# Altium footprint library Connector_PinHeader_1.00mm.PcbLib: 278 footprints (part 14 of 18) (continued)
## PinHeader_2x20_P1.00mm_Horizontal [mm] (continued)
F.CrtYd:
  lines w0.05: -1,-20 5.6,-20 5.6,1 -1,1 -1,-20
F.Fab:
  lines w0.1: 1.9,-19.15 -0.15,-19.15 -0.15,-18.85 1.9,-18.85 ; 1.9,-18.15 -0.15,-18.15 -0.15,-17.85 1.9,-17.85 ; 1.9,-17.15 -0.15,-17.15 -0.15,-16.85 1.9,-16.85 ; 1.9,-16.15 -0.15,-16.15 -0.15,-15.85 1.9,-15.85 ; 1.9,-15.15 -0.15,-15.15 -0.15,-14.85 1.9,-14.85 ; 1.9,-14.15 -0.15,-14.15 -0.15,-13.85 1.9,-13.85 ; 1.9,-13.15 -0.15,-13.15 -0.15,-12.85 1.9,-12.85 ; 1.9,-12.15 -0.15,-12.15 -0.15,-11.85 1.9,-11.85 ; 1.9,-11.15 -0.15,-11.15 -0.15,-10.85 1.9,-10.85 ; 1.9,-10.15 -0.15,-10.15 -0.15,-9.85 1.9,-9.85 ; 1.9,-9.15 -0.15,-9.15 -0.15,-8.85 1.9,-8.85 ; 1.9,-8.15 -0.15,-8.15 -0.15,-7.85 1.9,-7.85 ; 1.9,-7.15 -0.15,-7.15 -0.15,-6.85 1.9,-6.85 ; 1.9,-6.15 -0.15,-6.15 -0.15,-5.85 1.9,-5.85 ; 1.9,-5.15 -0.15,-5.15 -0.15,-4.85 1.9,-4.85 ; 1.9,-4.15 -0.15,-4.15 -0.15,-3.85 1.9,-3.85 ; 1.9,-3.15 -0.15,-3.15 -0.15,-2.85 1.9,-2.85 ; 1.9,-2.15 -0.15,-2.15 -0.15,-1.85 1.9,-1.85 ; 1.9,-1.15 -0.15,-1.15 -0.15,-0.85 1.9,-0.85 ; 1.9,-0.15 -0.15,-0.15 -0.15,0.15 1.9,0.15 ; 3.1,-19.15 5.1,-19.15 5.1,-18.85 3.1,-18.85 ; 3.1,-18.15 5.1,-18.15 5.1,-17.85 3.1,-17.85 ; 3.1,-17.15 5.1,-17.15 5.1,-16.85 3.1,-16.85 ; 3.1,-16.15 5.1,-16.15 5.1,-15.85 3.1,-15.85 ; 3.1,-15.15 5.1,-15.15 5.1,-14.85 3.1,-14.85 ; 3.1,-14.15 5.1,-14.15 5.1,-13.85 3.1,-13.85 ; 3.1,-13.15 5.1,-13.15 5.1,-12.85 3.1,-12.85 ; 3.1,-12.15 5.1,-12.15 5.1,-11.85 3.1,-11.85 ; 3.1,-11.15 5.1,-11.15 5.1,-10.85 3.1,-10.85 ; 3.1,-10.15 5.1,-10.15 5.1,-9.85 3.1,-9.85 ; 3.1,-9.15 5.1,-9.15 5.1,-8.85 3.1,-8.85 ; 3.1,-8.15 5.1,-8.15 5.1,-7.85 3.1,-7.85 ; 3.1,-7.15 5.1,-7.15 5.1,-6.85 3.1,-6.85 ; 3.1,-6.15 5.1,-6.15 5.1,-5.85 3.1,-5.85 ; 3.1,-5.15 5.1,-5.15 5.1,-4.85 3.1,-4.85 ; 3.1,-4.15 5.1,-4.15 5.1,-3.85 3.1,-3.85 ; 3.1,-3.15 5.1,-3.15 5.1,-2.85 3.1,-2.85 ; 3.1,-2.15 5.1,-2.15 5.1,-1.85 3.1,-1.85 ; 3.1,-1.15 5.1,-1.15 5.1,-0.85 3.1,-0.85 ; 3.1,-0.15 5.1,-0.15 5.1,0.15 3.1,0.15 ; 1.9,-19.5 1.9,0.2 2.2,0.5 3.1,0.5 3.1,-19.5 1.9,-19.5
  text "'.Designator'" at 3.105,-12.414 h0.72

## PinHeader_2x20_P1.00mm_Vertical [mm]
pads (40):
  rect 0.85x0.85 hole 0.5: 1(0,0)
  rrect100% 0.85x0.85 hole 0.5: 2(1,0) 3(0,-1) 4(1,-1) 5(0,-2) 6(1,-2) 7(0,-3) 8(1,-3) 9(0,-4) 10(1,-4) 11(0,-5) 12(1,-5) 13(0,-6) 14(1,-6) 15(0,-7) 16(1,-7) 17(0,-8) 18(1,-8) 19(0,-9) 20(1,-9) 21(0,-10) 22(1,-10) 23(0,-11) 24(1,-11) 25(0,-12) 26(1,-12) 27(0,-13) 28(1,-13) 29(0,-14) 30(1,-14) 31(0,-15) 32(1,-15) 33(0,-16) 34(1,-16) 35(0,-17) 36(1,-17) 37(0,-18) 38(1,-18) 39(0,-19) 40(1,-19)
F.SilkS:
  lines w0.12: -0.71,0 -0.71,0.685 0,0.685 ; -0.608,-0.685 -0.71,-0.685 -0.71,-19.56 -0.394,-19.56 ; 0.394,-19.56 0.606,-19.56 ; 1.394,-19.56 1.71,-19.56 1.71,0.56 1.394,0.56
F.CrtYd:
  lines w0.05: -1.15,-20 2.15,-20 2.15,1 -1.15,1 -1.15,-20
F.Fab:
  lines w0.1: -0.65,-19.5 1.65,-19.5 1.65,0.5 -0.075,0.5 -0.65,-0.075 -0.65,-19.5
  text "'.Designator'" at 1.34,-13.547 h1

## PinHeader_2x20_P1.00mm_Vertical_SMD [mm]
pads (40):
  rect 2x0.5 smd: 1(-1.65,9.5) 2(1.65,9.5) 3(-1.65,8.5) 4(1.65,8.5) 5(-1.65,7.5) 6(1.65,7.5) 7(-1.65,6.5) 8(1.65,6.5) 9(-1.65,5.5) 10(1.65,5.5) 11(-1.65,4.5) 12(1.65,4.5) 13(-1.65,3.5) 14(1.65,3.5) 15(-1.65,2.5) 16(1.65,2.5) 17(-1.65,1.5) 18(1.65,1.5) 19(-1.65,0.5) 20(1.65,0.5) 21(-1.65,-0.5) 22(1.65,-0.5) 23(-1.65,-1.5) 24(1.65,-1.5) 25(-1.65,-2.5) 26(1.65,-2.5) 27(-1.65,-3.5) 28(1.65,-3.5) 29(-1.65,-4.5) 30(1.65,-4.5) 31(-1.65,-5.5) 32(1.65,-5.5) 33(-1.65,-6.5) 34(1.65,-6.5) 35(-1.65,-7.5) 36(1.65,-7.5) 37(-1.65,-8.5) 38(1.65,-8.5) 39(-1.65,-9.5) 40(1.65,-9.5)
F.SilkS:
  lines w0.12: -2.59,10.01 -1.21,10.01 -1.21,10.06 1.21,10.06 1.21,10.01 ; -1.21,-10.01 -1.21,-10.06 1.21,-10.06 1.21,-10.01
F.CrtYd:
  lines w0.05: -3.65,-10.5 3.65,-10.5 3.65,10.5 -3.65,10.5 -3.65,-10.5
F.Fab:
  lines w0.1: -1.15,-9.65 -2.4,-9.65 -2.4,-9.35 -1.15,-9.35 ; -1.15,-8.65 -2.4,-8.65 -2.4,-8.35 -1.15,-8.35 ; -1.15,-7.65 -2.4,-7.65 -2.4,-7.35 -1.15,-7.35 ; -1.15,-6.65 -2.4,-6.65 -2.4,-6.35 -1.15,-6.35 ; -1.15,-5.65 -2.4,-5.65 -2.4,-5.35 -1.15,-5.35 ; -1.15,-4.65 -2.4,-4.65 -2.4,-4.35 -1.15,-4.35 ; -1.15,-3.65 -2.4,-3.65 -2.4,-3.35 -1.15,-3.35 ; -1.15,-2.65 -2.4,-2.65 -2.4,-2.35 -1.15,-2.35 ; -1.15,-1.65 -2.4,-1.65 -2.4,-1.35 -1.15,-1.35 ; -1.15,-0.65 -2.4,-0.65 -2.4,-0.35 -1.15,-0.35 ; -1.15,0.35 -2.4,0.35 -2.4,0.65 -1.15,0.65 ; -1.15,1.35 -2.4,1.35 -2.4,1.65 -1.15,1.65 ; -1.15,2.35 -2.4,2.35 -2.4,2.65 -1.15,2.65 ; -1.15,3.35 -2.4,3.35 -2.4,3.65 -1.15,3.65 ; -1.15,4.35 -2.4,4.35 -2.4,4.65 -1.15,4.65 ; -1.15,5.35 -2.4,5.35 -2.4,5.65 -1.15,5.65 ; -1.15,6.35 -2.4,6.35 -2.4,6.65 -1.15,6.65 ; -1.15,7.35 -2.4,7.35 -2.4,7.65 -1.15,7.65 ; -1.15,8.35 -2.4,8.35 -2.4,8.65 -1.15,8.65 ; -1.15,9.35 -2.4,9.35 -2.4,9.65 -1.15,9.65 ; 1.15,-9.65 2.4,-9.65 2.4,-9.35 1.15,-9.35 ; 1.15,-8.65 2.4,-8.65 2.4,-8.35 1.15,-8.35 ; 1.15,-7.65 2.4,-7.65 2.4,-7.35 1.15,-7.35 ; 1.15,-6.65 2.4,-6.65 2.4,-6.35 1.15,-6.35 ; 1.15,-5.65 2.4,-5.65 2.4,-5.35 1.15,-5.35 ; 1.15,-4.65 2.4,-4.65 2.4,-4.35 1.15,-4.35 ; 1.15,-3.65 2.4,-3.65 2.4,-3.35 1.15,-3.35 ; 1.15,-2.65 2.4,-2.65 2.4,-2.35 1.15,-2.35 ; 1.15,-1.65 2.4,-1.65 2.4,-1.35 1.15,-1.35 ; 1.15,-0.65 2.4,-0.65 2.4,-0.35 1.15,-0.35 ; 1.15,0.35 2.4,0.35 2.4,0.65 1.15,0.65 ; 1.15,1.35 2.4,1.35 2.4,1.65 1.15,1.65 ; 1.15,2.35 2.4,2.35 2.4,2.65 1.15,2.65 ; 1.15,3.35 2.4,3.35 2.4,3.65 1.15,3.65 ; 1.15,4.35 2.4,4.35 2.4,4.65 1.15,4.65 ; 1.15,5.35 2.4,5.35 2.4,5.65 1.15,5.65 ; 1.15,6.35 2.4,6.35 2.4,6.65 1.15,6.65 ; 1.15,7.35 2.4,7.35 2.4,7.65 1.15,7.65 ; 1.15,8.35 2.4,8.35 2.4,8.65 1.15,8.65 ; 1.15,9.35 2.4,9.35 2.4,9.65 1.15,9.65 ; -1.15,9.65 -1.15,-10 1.15,-10 1.15,10 -0.8,10 -1.15,9.65
  text "'.Designator'" at 0.84,-4.047 h1

## PinHeader_2x21_P1.00mm_Horizontal [mm]
pads (42):
  rect 0.85x0.85 hole 0.5: 1(0,0)
  rrect100% 0.85x0.85 hole 0.5: 2(1,0) 3(0,-1) 4(1,-1) 5(0,-2) 6(1,-2) 7(0,-3) 8(1,-3) 9(0,-4) 10(1,-4) 11(0,-5) 12(1,-5) 13(0,-6) 14(1,-6) 15(0,-7) 16(1,-7) 17(0,-8) 18(1,-8) 19(0,-9) 20(1,-9) 21(0,-10) 22(1,-10) 23(0,-11) 24(1,-11) 25(0,-12) 26(1,-12) 27(0,-13) 28(1,-13) 29(0,-14) 30(1,-14) 31(0,-15) 32(1,-15) 33(0,-16) 34(1,-16) 35(0,-17) 36(1,-17) 37(0,-18) 38(1,-18) 39(0,-19) 40(1,-19) 41(0,-20) 42(1,-20)
F.SilkS:
  lines w0.12: -0.685,0 -0.685,0.685 0,0.685 ; 1.652,-20.21 1.84,-20.21 ; 1.652,-19.79 1.84,-19.79 ; 1.652,-19.21 1.84,-19.21 ; 1.652,-18.79 1.84,-18.79 ; 1.652,-18.21 1.84,-18.21 ; 1.652,-17.79 1.84,-17.79 ; 1.652,-17.21 1.84,-17.21 ; 1.652,-16.79 1.84,-16.79 ; 1.652,-16.21 1.84,-16.21 ; 1.652,-15.79 1.84,-15.79 ; 1.652,-15.21 1.84,-15.21 ; 1.652,-14.79 1.84,-14.79 ; 1.652,-14.21 1.84,-14.21 ; 1.652,-13.79 1.84,-13.79 ; 1.652,-13.21 1.84,-13.21 ; 1.652,-12.79 1.84,-12.79 ; 1.652,-12.21 1.84,-12.21 ; 1.652,-11.79 1.84,-11.79 ; 1.652,-11.21 1.84,-11.21 ; 1.652,-10.79 1.84,-10.79 ; 1.652,-10.21 1.84,-10.21 ; 1.652,-9.79 1.84,-9.79 ; 1.652,-9.21 1.84,-9.21 ; 1.652,-8.79 1.84,-8.79 ; 1.652,-8.21 1.84,-8.21 ; 1.652,-7.79 1.84,-7.79 ; 1.652,-7.21 1.84,-7.21 ; 1.652,-6.79 1.84,-6.79 ; 1.652,-6.21 1.84,-6.21 ; 1.652,-5.79 1.84,-5.79 ; 1.652,-5.21 1.84,-5.21 ; 1.652,-4.79 1.84,-4.79 ; 1.652,-4.21 1.84,-4.21 ; 1.652,-3.79 1.84,-3.79 ; 1.652,-3.21 1.84,-3.21 ; 1.652,-2.79 1.84,-2.79 ; 1.652,-2.21 1.84,-2.21 ; 1.652,-1.79 1.84,-1.79 ; 1.652,-1.21 1.84,-1.21 ; 1.652,-0.79 1.84,-0.79 ; 1.652,-0.21 1.84,-0.21 ; 1.652,0.21 1.84,0.21 ; 1.84,-19.5 3.16,-19.5 ; 1.84,-18.5 3.16,-18.5 ; 1.84,-17.5 3.16,-17.5 ; 1.84,-16.5 3.16,-16.5 ; 1.84,-15.5 3.16,-15.5 ; 1.84,-14.5 3.16,-14.5 ; 1.84,-13.5 3.16,-13.5 ; 1.84,-12.5 3.16,-12.5 ; 1.84,-11.5 3.16,-11.5 ; 1.84,-10.5 3.16,-10.5 ; 1.84,-9.5 3.16,-9.5 ; 1.84,-8.5 3.16,-8.5 ; 1.84,-7.5 3.16,-7.5 ; 1.84,-6.5 3.16,-6.5 ; 1.84,-5.5 3.16,-5.5 ; 1.84,-4.5 3.16,-4.5 ; 1.84,-3.5 3.16,-3.5 ; 1.84,-2.5 3.16,-2.5 ; 1.84,-1.5 3.16,-1.5 ; 1.84,-0.5 3.16,-0.5 ; 3.16,-20.21 5.16,-20.21 5.16,-19.79 3.16,-19.79 ; 3.16,-19.21 5.16,-19.21 5.16,-18.79 3.16,-18.79 ; 3.16,-18.21 5.16,-18.21 5.16,-17.79 3.16,-17.79 ; 3.16,-17.21 5.16,-17.21 5.16,-16.79 3.16,-16.79 ; 3.16,-16.21 5.16,-16.21 5.16,-15.79 3.16,-15.79 ; 3.16,-15.21 5.16,-15.21 5.16,-14.79 3.16,-14.79 ; 3.16,-14.21 5.16,-14.21 5.16,-13.79 3.16,-13.79 ; 3.16,-13.21 5.16,-13.21 5.16,-12.79 3.16,-12.79 ; 3.16,-12.21 5.16,-12.21 5.16,-11.79 3.16,-11.79 ; 3.16,-11.21 5.16,-11.21 5.16,-10.79 3.16,-10.79 ; 3.16,-10.21 5.16,-10.21 5.16,-9.79 3.16,-9.79 ; 3.16,-9.21 5.16,-9.21 5.16,-8.79 3.16,-8.79 ; 3.16,-8.21 5.16,-8.21 5.16,-7.79 3.16,-7.79 ; 3.16,-7.21 5.16,-7.21 5.16,-6.79 3.16,-6.79 ; 3.16,-6.21 5.16,-6.21 5.16,-5.79 3.16,-5.79 ; 3.16,-5.21 5.16,-5.21 5.16,-4.79 3.16,-4.79 ; 3.16,-4.21 5.16,-4.21 5.16,-3.79 3.16,-3.79 ; 3.16,-3.21 5.16,-3.21 5.16,-2.79 3.16,-2.79 ; 3.16,-2.21 5.16,-2.21 5.16,-1.79 3.16,-1.79 ; 3.16,-1.21 5.16,-1.21 5.16,-0.79 3.16,-0.79 ; 3.16,-0.21 5.16,-0.21 5.16,0.21 3.16,0.21 ; 3.16,-0.09 5.16,-0.09 ; 3.16,0.03 5.16,0.03 ; 3.16,0.15 5.16,0.15 ; 1.84,-20.56 3.16,-20.56 3.16,0.56 1.84,0.56 1.84,-20.56
F.CrtYd:
  lines w0.05: -1,-21 -1,1 5.6,1 5.6,-21 -1,-21
F.Fab:
  lines w0.1: 1.9,-20.15 -0.15,-20.15 -0.15,-19.85 1.9,-19.85 ; 1.9,-19.15 -0.15,-19.15 -0.15,-18.85 1.9,-18.85 ; 1.9,-18.15 -0.15,-18.15 -0.15,-17.85 1.9,-17.85 ; 1.9,-17.15 -0.15,-17.15 -0.15,-16.85 1.9,-16.85 ; 1.9,-16.15 -0.15,-16.15 -0.15,-15.85 1.9,-15.85 ; 1.9,-15.15 -0.15,-15.15 -0.15,-14.85 1.9,-14.85 ; 1.9,-14.15 -0.15,-14.15 -0.15,-13.85 1.9,-13.85 ; 1.9,-13.15 -0.15,-13.15 -0.15,-12.85 1.9,-12.85 ; 1.9,-12.15 -0.15,-12.15 -0.15,-11.85 1.9,-11.85 ; 1.9,-11.15 -0.15,-11.15 -0.15,-10.85 1.9,-10.85 ; 1.9,-10.15 -0.15,-10.15 -0.15,-9.85 1.9,-9.85 ; 1.9,-9.15 -0.15,-9.15 -0.15,-8.85 1.9,-8.85 ; 1.9,-8.15 -0.15,-8.15 -0.15,-7.85 1.9,-7.85 ; 1.9,-7.15 -0.15,-7.15 -0.15,-6.85 1.9,-6.85 ; 1.9,-6.15 -0.15,-6.15 -0.15,-5.85 1.9,-5.85 ; 1.9,-5.15 -0.15,-5.15 -0.15,-4.85 1.9,-4.85 ; 1.9,-4.15 -0.15,-4.15 -0.15,-3.85 1.9,-3.85 ; 1.9,-3.15 -0.15,-3.15 -0.15,-2.85 1.9,-2.85 ; 1.9,-2.15 -0.15,-2.15 -0.15,-1.85 1.9,-1.85 ; 1.9,-1.15 -0.15,-1.15 -0.15,-0.85 1.9,-0.85 ; 1.9,-0.15 -0.15,-0.15 -0.15,0.15 1.9,0.15 ; 3.1,-20.15 5.1,-20.15 5.1,-19.85 3.1,-19.85 ; 3.1,-19.15 5.1,-19.15 5.1,-18.85 3.1,-18.85 ; 3.1,-18.15 5.1,-18.15 5.1,-17.85 3.1,-17.85 ; 3.1,-17.15 5.1,-17.15 5.1,-16.85 3.1,-16.85 ; 3.1,-16.15 5.1,-16.15 5.1,-15.85 3.1,-15.85 ; 3.1,-15.15 5.1,-15.15 5.1,-14.85 3.1,-14.85 ; 3.1,-14.15 5.1,-14.15 5.1,-13.85 3.1,-13.85 ; 3.1,-13.15 5.1,-13.15 5.1,-12.85 3.1,-12.85 ; 3.1,-12.15 5.1,-12.15 5.1,-11.85 3.1,-11.85 ; 3.1,-11.15 5.1,-11.15 5.1,-10.85 3.1,-10.85 ; 3.1,-10.15 5.1,-10.15 5.1,-9.85 3.1,-9.85 ; 3.1,-9.15 5.1,-9.15 5.1,-8.85 3.1,-8.85 ; 3.1,-8.15 5.1,-8.15 5.1,-7.85 3.1,-7.85 ; 3.1,-7.15 5.1,-7.15 5.1,-6.85 3.1,-6.85 ; 3.1,-6.15 5.1,-6.15 5.1,-5.85 3.1,-5.85 ; 3.1,-5.15 5.1,-5.15 5.1,-4.85 3.1,-4.85 ; 3.1,-4.15 5.1,-4.15 5.1,-3.85 3.1,-3.85 ; 3.1,-3.15 5.1,-3.15 5.1,-2.85 3.1,-2.85 ; 3.1,-2.15 5.1,-2.15 5.1,-1.85 3.1,-1.85 ; 3.1,-1.15 5.1,-1.15 5.1,-0.85 3.1,-0.85 ; 3.1,-0.15 5.1,-0.15 5.1,0.15 3.1,0.15 ; 1.9,-20.5 1.9,0.2 2.2,0.5 3.1,0.5 3.1,-20.5 1.9,-20.5
  text "'.Designator'" at 3.105,-12.914 h0.72

## PinHeader_2x21_P1.00mm_Vertical [mm]
pads (42):
  rect 0.85x0.85 hole 0.5: 1(0,0)
  rrect100% 0.85x0.85 hole 0.5: 2(1,0) 3(0,-1) 4(1,-1) 5(0,-2) 6(1,-2) 7(0,-3) 8(1,-3) 9(0,-4) 10(1,-4) 11(0,-5) 12(1,-5) 13(0,-6) 14(1,-6) 15(0,-7) 16(1,-7) 17(0,-8) 18(1,-8) 19(0,-9) 20(1,-9) 21(0,-10) 22(1,-10) 23(0,-11) 24(1,-11) 25(0,-12) 26(1,-12) 27(0,-13) 28(1,-13) 29(0,-14) 30(1,-14) 31(0,-15) 32(1,-15) 33(0,-16) 34(1,-16) 35(0,-17) 36(1,-17) 37(0,-18) 38(1,-18) 39(0,-19) 40(1,-19) 41(0,-20) 42(1,-20)
F.SilkS:
  lines w0.12: -0.71,0 -0.71,0.685 0,0.685 ; -0.608,-0.685 -0.71,-0.685 -0.71,-20.56 -0.394,-20.56 ; 0.394,-20.56 0.606,-20.56 ; 1.394,-20.56 1.71,-20.56 1.71,0.56 1.394,0.56
F.CrtYd:
  lines w0.05: -1.15,-21 -1.15,1 2.15,1 2.15,-21 -1.15,-21
F.Fab:
  lines w0.1: -0.65,-20.5 -0.65,-0.075 -0.075,0.5 1.65,0.5 1.65,-20.5 -0.65,-20.5
  text "'.Designator'" at 1.34,-14.047 h1

## PinHeader_2x21_P1.00mm_Vertical_SMD [mm]
pads (42):
  rect 2x0.5 smd: 1(-1.65,10) 2(1.65,10) 3(-1.65,9) 4(1.65,9) 5(-1.65,8) 6(1.65,8) 7(-1.65,7) 8(1.65,7) 9(-1.65,6) 10(1.65,6) 11(-1.65,5) 12(1.65,5) 13(-1.65,4) 14(1.65,4) 15(-1.65,3) 16(1.65,3) 17(-1.65,2) 18(1.65,2) 19(-1.65,1) 20(1.65,1) 21(-1.65,0) 22(1.65,0) 23(-1.65,-1) 24(1.65,-1) 25(-1.65,-2) 26(1.65,-2) 27(-1.65,-3) 28(1.65,-3) 29(-1.65,-4) 30(1.65,-4) 31(-1.65,-5) 32(1.65,-5) 33(-1.65,-6) 34(1.65,-6) 35(-1.65,-7) 36(1.65,-7) 37(-1.65,-8) 38(1.65,-8) 39(-1.65,-9) 40(1.65,-9) 41(-1.65,-10) 42(1.65,-10)
F.SilkS:
  lines w0.12: -2.59,10.51 -1.21,10.51 -1.21,10.56 1.21,10.56 1.21,10.51 ; -1.21,-10.51 -1.21,-10.56 1.21,-10.56 1.21,-10.51
F.CrtYd:
  lines w0.05: -3.65,-11 3.65,-11 3.65,11 -3.65,11 -3.65,-11
F.Fab:
  lines w0.1: -1.15,-10.15 -2.4,-10.15 -2.4,-9.85 -1.15,-9.85 ; -1.15,-9.15 -2.4,-9.15 -2.4,-8.85 -1.15,-8.85 ; -1.15,-8.15 -2.4,-8.15 -2.4,-7.85 -1.15,-7.85 ; -1.15,-7.15 -2.4,-7.15 -2.4,-6.85 -1.15,-6.85 ; -1.15,-6.15 -2.4,-6.15 -2.4,-5.85 -1.15,-5.85 ; -1.15,-5.15 -2.4,-5.15 -2.4,-4.85 -1.15,-4.85 ; -1.15,-4.15 -2.4,-4.15 -2.4,-3.85 -1.15,-3.85 ; -1.15,-3.15 -2.4,-3.15 -2.4,-2.85 -1.15,-2.85 ; -1.15,-2.15 -2.4,-2.15 -2.4,-1.85 -1.15,-1.85 ; -1.15,-1.15 -2.4,-1.15 -2.4,-0.85 -1.15,-0.85 ; -1.15,-0.15 -2.4,-0.15 -2.4,0.15 -1.15,0.15 ; -1.15,0.85 -2.4,0.85 -2.4,1.15 -1.15,1.15 ; -1.15,1.85 -2.4,1.85 -2.4,2.15 -1.15,2.15 ; -1.15,2.85 -2.4,2.85 -2.4,3.15 -1.15,3.15 ; -1.15,3.85 -2.4,3.85 -2.4,4.15 -1.15,4.15 ; -1.15,4.85 -2.4,4.85 -2.4,5.15 -1.15,5.15 ; -1.15,5.85 -2.4,5.85 -2.4,6.15 -1.15,6.15 ; -1.15,6.85 -2.4,6.85 -2.4,7.15 -1.15,7.15 ; -1.15,7.85 -2.4,7.85 -2.4,8.15 -1.15,8.15 ; -1.15,8.85 -2.4,8.85 -2.4,9.15 -1.15,9.15 ; -1.15,9.85 -2.4,9.85 -2.4,10.15 -1.15,10.15 ; 1.15,-10.15 2.4,-10.15 2.4,-9.85 1.15,-9.85 ; 1.15,-9.15 2.4,-9.15 2.4,-8.85 1.15,-8.85 ; 1.15,-8.15 2.4,-8.15 2.4,-7.85 1.15,-7.85 ; 1.15,-7.15 2.4,-7.15 2.4,-6.85 1.15,-6.85 ; 1.15,-6.15 2.4,-6.15 2.4,-5.85 1.15,-5.85 ; 1.15,-5.15 2.4,-5.15 2.4,-4.85 1.15,-4.85 ; 1.15,-4.15 2.4,-4.15 2.4,-3.85 1.15,-3.85 ; 1.15,-3.15 2.4,-3.15 2.4,-2.85 1.15,-2.85 ; 1.15,-2.15 2.4,-2.15 2.4,-1.85 1.15,-1.85 ; 1.15,-1.15 2.4,-1.15 2.4,-0.85 1.15,-0.85 ; 1.15,-0.15 2.4,-0.15 2.4,0.15 1.15,0.15 ; 1.15,0.85 2.4,0.85 2.4,1.15 1.15,1.15 ; 1.15,1.85 2.4,1.85 2.4,2.15 1.15,2.15 ; 1.15,2.85 2.4,2.85 2.4,3.15 1.15,3.15 ; 1.15,3.85 2.4,3.85 2.4,4.15 1.15,4.15 ; 1.15,4.85 2.4,4.85 2.4,5.15 1.15,5.15 ; 1.15,5.85 2.4,5.85 2.4,6.15 1.15,6.15 ; 1.15,6.85 2.4,6.85 2.4,7.15 1.15,7.15 ; 1.15,7.85 2.4,7.85 2.4,8.15 1.15,8.15 ; 1.15,8.85 2.4,8.85 2.4,9.15 1.15,9.15 ; 1.15,9.85 2.4,9.85 2.4,10.15 1.15,10.15 ; -1.15,10.15 -1.15,-10.5 1.15,-10.5 1.15,10.5 -0.8,10.5 -1.15,10.15
  text "'.Designator'" at 0.84,-4.047 h1

## PinHeader_2x22_P1.00mm_Horizontal [mm]
pads (44):
  rect 0.85x0.85 hole 0.5: 1(0,0)
  rrect100% 0.85x0.85 hole 0.5: 2(1,0) 3(0,-1) 4(1,-1) 5(0,-2) 6(1,-2) 7(0,-3) 8(1,-3) 9(0,-4) 10(1,-4) 11(0,-5) 12(1,-5) 13(0,-6) 14(1,-6) 15(0,-7) 16(1,-7) 17(0,-8) 18(1,-8) 19(0,-9) 20(1,-9) 21(0,-10) 22(1,-10) 23(0,-11) 24(1,-11) 25(0,-12) 26(1,-12) 27(0,-13) 28(1,-13) 29(0,-14) 30(1,-14) 31(0,-15) 32(1,-15) 33(0,-16) 34(1,-16) 35(0,-17) 36(1,-17) 37(0,-18) 38(1,-18) 39(0,-19) 40(1,-19) 41(0,-20) 42(1,-20) 43(0,-21) 44(1,-21)
F.SilkS:
  lines w0.12: -0.685,0 -0.685,0.685 0,0.685 ; 1.652,-21.21 1.84,-21.21 ; 1.652,-20.79 1.84,-20.79 ; 1.652,-20.21 1.84,-20.21 ; 1.652,-19.79 1.84,-19.79 ; 1.652,-19.21 1.84,-19.21 ; 1.652,-18.79 1.84,-18.79 ; 1.652,-18.21 1.84,-18.21 ; 1.652,-17.79 1.84,-17.79 ; 1.652,-17.21 1.84,-17.21 ; 1.652,-16.79 1.84,-16.79 ; 1.652,-16.21 1.84,-16.21 ; 1.652,-15.79 1.84,-15.79 ; 1.652,-15.21 1.84,-15.21 ; 1.652,-14.79 1.84,-14.79 ; 1.652,-14.21 1.84,-14.21 ; 1.652,-13.79 1.84,-13.79 ; 1.652,-13.21 1.84,-13.21 ; 1.652,-12.79 1.84,-12.79 ; 1.652,-12.21 1.84,-12.21 ; 1.652,-11.79 1.84,-11.79 ; 1.652,-11.21 1.84,-11.21 ; 1.652,-10.79 1.84,-10.79 ; 1.652,-10.21 1.84,-10.21 ; 1.652,-9.79 1.84,-9.79 ; 1.652,-9.21 1.84,-9.21 ; 1.652,-8.79 1.84,-8.79 ; 1.652,-8.21 1.84,-8.21 ; 1.652,-7.79 1.84,-7.79 ; 1.652,-7.21 1.84,-7.21 ; 1.652,-6.79 1.84,-6.79 ; 1.652,-6.21 1.84,-6.21 ; 1.652,-5.79 1.84,-5.79 ; 1.652,-5.21 1.84,-5.21 ; 1.652,-4.79 1.84,-4.79 ; 1.652,-4.21 1.84,-4.21 ; 1.652,-3.79 1.84,-3.79 ; 1.652,-3.21 1.84,-3.21 ; 1.652,-2.79 1.84,-2.79 ; 1.652,-2.21 1.84,-2.21 ; 1.652,-1.79 1.84,-1.79 ; 1.652,-1.21 1.84,-1.21 ; 1.652,-0.79 1.84,-0.79 ; 1.652,-0.21 1.84,-0.21 ; 1.652,0.21 1.84,0.21 ; 1.84,-20.5 3.16,-20.5 ; 1.84,-19.5 3.16,-19.5 ; 1.84,-18.5 3.16,-18.5 ; 1.84,-17.5 3.16,-17.5 ; 1.84,-16.5 3.16,-16.5 ; 1.84,-15.5 3.16,-15.5 ; 1.84,-14.5 3.16,-14.5 ; 1.84,-13.5 3.16,-13.5 ; 1.84,-12.5 3.16,-12.5 ; 1.84,-11.5 3.16,-11.5 ; 1.84,-10.5 3.16,-10.5 ; 1.84,-9.5 3.16,-9.5 ; 1.84,-8.5 3.16,-8.5 ; 1.84,-7.5 3.16,-7.5 ; 1.84,-6.5 3.16,-6.5 ; 1.84,-5.5 3.16,-5.5 ; 1.84,-4.5 3.16,-4.5 ; 1.84,-3.5 3.16,-3.5 ; 1.84,-2.5 3.16,-2.5 ; 1.84,-1.5 3.16,-1.5 ; 1.84,-0.5 3.16,-0.5 ; 3.16,-21.21 5.16,-21.21 5.16,-20.79 3.16,-20.79 ; 3.16,-20.21 5.16,-20.21 5.16,-19.79 3.16,-19.79 ; 3.16,-19.21 5.16,-19.21 5.16,-18.79 3.16,-18.79 ; 3.16,-18.21 5.16,-18.21 5.16,-17.79 3.16,-17.79 ; 3.16,-17.21 5.16,-17.21 5.16,-16.79 3.16,-16.79 ; 3.16,-16.21 5.16,-16.21 5.16,-15.79 3.16,-15.79 ; 3.16,-15.21 5.16,-15.21 5.16,-14.79 3.16,-14.79 ; 3.16,-14.21 5.16,-14.21 5.16,-13.79 3.16,-13.79 ; 3.16,-13.21 5.16,-13.21 5.16,-12.79 3.16,-12.79 ; 3.16,-12.21 5.16,-12.21 5.16,-11.79 3.16,-11.79 ; 3.16,-11.21 5.16,-11.21 5.16,-10.79 3.16,-10.79 ; 3.16,-10.21 5.16,-10.21 5.16,-9.79 3.16,-9.79 ; 3.16,-9.21 5.16,-9.21 5.16,-8.79 3.16,-8.79 ; 3.16,-8.21 5.16,-8.21 5.16,-7.79 3.16,-7.79 ; 3.16,-7.21 5.16,-7.21 5.16,-6.79 3.16,-6.79 ; 3.16,-6.21 5.16,-6.21 5.16,-5.79 3.16,-5.79 ; 3.16,-5.21 5.16,-5.21 5.16,-4.79 3.16,-4.79 ; 3.16,-4.21 5.16,-4.21 5.16,-3.79 3.16,-3.79 ; 3.16,-3.21 5.16,-3.21 5.16,-2.79 3.16,-2.79 ; 3.16,-2.21 5.16,-2.21 5.16,-1.79 3.16,-1.79 ; 3.16,-1.21 5.16,-1.21 5.16,-0.79 3.16,-0.79 ; 3.16,-0.21 5.16,-0.21 5.16,0.21 3.16,0.21 ; 3.16,-0.09 5.16,-0.09 ; 3.16,0.03 5.16,0.03 ; 3.16,0.15 5.16,0.15 ; 1.84,-21.56 3.16,-21.56 3.16,0.56 1.84,0.56 1.84,-21.56
F.CrtYd:
  lines w0.05: -1,-22 -1,1 5.6,1 5.6,-22 -1,-22
F.Fab:
  lines w0.1: 1.9,-21.15 -0.15,-21.15 -0.15,-20.85 1.9,-20.85 ; 1.9,-20.15 -0.15,-20.15 -0.15,-19.85 1.9,-19.85 ; 1.9,-19.15 -0.15,-19.15 -0.15,-18.85 1.9,-18.85 ; 1.9,-18.15 -0.15,-18.15 -0.15,-17.85 1.9,-17.85 ; 1.9,-17.15 -0.15,-17.15 -0.15,-16.85 1.9,-16.85 ; 1.9,-16.15 -0.15,-16.15 -0.15,-15.85 1.9,-15.85 ; 1.9,-15.15 -0.15,-15.15 -0.15,-14.85 1.9,-14.85 ; 1.9,-14.15 -0.15,-14.15 -0.15,-13.85 1.9,-13.85 ; 1.9,-13.15 -0.15,-13.15 -0.15,-12.85 1.9,-12.85 ; 1.9,-12.15 -0.15,-12.15 -0.15,-11.85 1.9,-11.85 ; 1.9,-11.15 -0.15,-11.15 -0.15,-10.85 1.9,-10.85 ; 1.9,-10.15 -0.15,-10.15 -0.15,-9.85 1.9,-9.85 ; 1.9,-9.15 -0.15,-9.15 -0.15,-8.85 1.9,-8.85 ; 1.9,-8.15 -0.15,-8.15 -0.15,-7.85 1.9,-7.85 ; 1.9,-7.15 -0.15,-7.15 -0.15,-6.85 1.9,-6.85 ; 1.9,-6.15 -0.15,-6.15 -0.15,-5.85 1.9,-5.85 ; 1.9,-5.15 -0.15,-5.15 -0.15,-4.85 1.9,-4.85 ; 1.9,-4.15 -0.15,-4.15 -0.15,-3.85 1.9,-3.85 ; 1.9,-3.15 -0.15,-3.15 -0.15,-2.85 1.9,-2.85 ; 1.9,-2.15 -0.15,-2.15 -0.15,-1.85 1.9,-1.85 ; 1.9,-1.15 -0.15,-1.15 -0.15,-0.85 1.9,-0.85 ; 1.9,-0.15 -0.15,-0.15 -0.15,0.15 1.9,0.15 ; 3.1,-21.15 5.1,-21.15 5.1,-20.85 3.1,-20.85 ; 3.1,-20.15 5.1,-20.15 5.1,-19.85 3.1,-19.85 ; 3.1,-19.15 5.1,-19.15 5.1,-18.85 3.1,-18.85 ; 3.1,-18.15 5.1,-18.15 5.1,-17.85 3.1,-17.85 ; 3.1,-17.15 5.1,-17.15 5.1,-16.85 3.1,-16.85 ; 3.1,-16.15 5.1,-16.15 5.1,-15.85 3.1,-15.85 ; 3.1,-15.15 5.1,-15.15 5.1,-14.85 3.1,-14.85 ; 3.1,-14.15 5.1,-14.15 5.1,-13.85 3.1,-13.85 ; 3.1,-13.15 5.1,-13.15 5.1,-12.85 3.1,-12.85 ; 3.1,-12.15 5.1,-12.15 5.1,-11.85 3.1,-11.85 ; 3.1,-11.15 5.1,-11.15 5.1,-10.85 3.1,-10.85 ; 3.1,-10.15 5.1,-10.15 5.1,-9.85 3.1,-9.85 ; 3.1,-9.15 5.1,-9.15 5.1,-8.85 3.1,-8.85 ; 3.1,-8.15 5.1,-8.15 5.1,-7.85 3.1,-7.85 ; 3.1,-7.15 5.1,-7.15 5.1,-6.85 3.1,-6.85 ; 3.1,-6.15 5.1,-6.15 5.1,-5.85 3.1,-5.85 ; 3.1,-5.15 5.1,-5.15 5.1,-4.85 3.1,-4.85 ; 3.1,-4.15 5.1,-4.15 5.1,-3.85 3.1,-3.85 ; 3.1,-3.15 5.1,-3.15 5.1,-2.85 3.1,-2.85 ; 3.1,-2.15 5.1,-2.15 5.1,-1.85 3.1,-1.85 ; 3.1,-1.15 5.1,-1.15 5.1,-0.85 3.1,-0.85 ; 3.1,-0.15 5.1,-0.15 5.1,0.15 3.1,0.15 ; 1.9,-21.5 1.9,0.2 2.2,0.5 3.1,0.5 3.1,-21.5 1.9,-21.5
  text "'.Designator'" at 3.105,-13.414 h0.72

## PinHeader_2x22_P1.00mm_Vertical [mm]
pads (44):
  rect 0.85x0.85 hole 0.5: 1(0,0)
  rrect100% 0.85x0.85 hole 0.5: 2(1,0) 3(0,-1) 4(1,-1) 5(0,-2) 6(1,-2) 7(0,-3) 8(1,-3) 9(0,-4) 10(1,-4) 11(0,-5) 12(1,-5) 13(0,-6) 14(1,-6) 15(0,-7) 16(1,-7) 17(0,-8) 18(1,-8) 19(0,-9) 20(1,-9) 21(0,-10) 22(1,-10) 23(0,-11) 24(1,-11) 25(0,-12) 26(1,-12) 27(0,-13) 28(1,-13) 29(0,-14) 30(1,-14) 31(0,-15) 32(1,-15) 33(0,-16) 34(1,-16) 35(0,-17) 36(1,-17) 37(0,-18) 38(1,-18) 39(0,-19) 40(1,-19) 41(0,-20) 42(1,-20) 43(0,-21) 44(1,-21)
F.SilkS:
  lines w0.12: -0.71,0 -0.71,0.685 0,0.685 ; -0.608,-0.685 -0.71,-0.685 -0.71,-21.56 -0.394,-21.56 ; 0.394,-21.56 0.606,-21.56 ; 1.394,-21.56 1.71,-21.56 1.71,0.56 1.394,0.56
F.CrtYd:
  lines w0.05: -1.15,-22 2.15,-22 2.15,1 -1.15,1 -1.15,-22
F.Fab:
  lines w0.1: -0.65,-21.5 1.65,-21.5 1.65,0.5 -0.075,0.5 -0.65,-0.075 -0.65,-21.5
  text "'.Designator'" at 1.34,-14.547 h1

## PinHeader_2x22_P1.00mm_Vertical_SMD [mm]
pads (44):
  rect 2x0.5 smd: 1(-1.65,10.5) 2(1.65,10.5) 3(-1.65,9.5) 4(1.65,9.5) 5(-1.65,8.5) 6(1.65,8.5) 7(-1.65,7.5) 8(1.65,7.5) 9(-1.65,6.5) 10(1.65,6.5) 11(-1.65,5.5) 12(1.65,5.5) 13(-1.65,4.5) 14(1.65,4.5) 15(-1.65,3.5) 16(1.65,3.5) 17(-1.65,2.5) 18(1.65,2.5) 19(-1.65,1.5) 20(1.65,1.5) 21(-1.65,0.5) 22(1.65,0.5) 23(-1.65,-0.5) 24(1.65,-0.5) 25(-1.65,-1.5) 26(1.65,-1.5) 27(-1.65,-2.5) 28(1.65,-2.5) 29(-1.65,-3.5) 30(1.65,-3.5) 31(-1.65,-4.5) 32(1.65,-4.5) 33(-1.65,-5.5) 34(1.65,-5.5) 35(-1.65,-6.5) 36(1.65,-6.5) 37(-1.65,-7.5) 38(1.65,-7.5) 39(-1.65,-8.5) 40(1.65,-8.5) 41(-1.65,-9.5) 42(1.65,-9.5) 43(-1.65,-10.5) 44(1.65,-10.5)
F.SilkS:
  lines w0.12: -2.59,11.01 -1.21,11.01 -1.21,11.06 1.21,11.06 1.21,11.01 ; -1.21,-11.01 -1.21,-11.06 1.21,-11.06 1.21,-11.01
F.CrtYd:
  lines w0.05: -3.65,-11.5 -3.65,11.5 3.65,11.5 3.65,-11.5 -3.65,-11.5
F.Fab:
  lines w0.1: -1.15,-10.65 -2.4,-10.65 -2.4,-10.35 -1.15,-10.35 ; -1.15,-9.65 -2.4,-9.65 -2.4,-9.35 -1.15,-9.35 ; -1.15,-8.65 -2.4,-8.65 -2.4,-8.35 -1.15,-8.35 ; -1.15,-7.65 -2.4,-7.65 -2.4,-7.35 -1.15,-7.35 ; -1.15,-6.65 -2.4,-6.65 -2.4,-6.35 -1.15,-6.35 ; -1.15,-5.65 -2.4,-5.65 -2.4,-5.35 -1.15,-5.35 ; -1.15,-4.65 -2.4,-4.65 -2.4,-4.35 -1.15,-4.35 ; -1.15,-3.65 -2.4,-3.65 -2.4,-3.35 -1.15,-3.35 ; -1.15,-2.65 -2.4,-2.65 -2.4,-2.35 -1.15,-2.35 ; -1.15,-1.65 -2.4,-1.65 -2.4,-1.35 -1.15,-1.35 ; -1.15,-0.65 -2.4,-0.65 -2.4,-0.35 -1.15,-0.35 ; -1.15,0.35 -2.4,0.35 -2.4,0.65 -1.15,0.65 ; -1.15,1.35 -2.4,1.35 -2.4,1.65 -1.15,1.65 ; -1.15,2.35 -2.4,2.35 -2.4,2.65 -1.15,2.65 ; -1.15,3.35 -2.4,3.35 -2.4,3.65 -1.15,3.65 ; -1.15,4.35 -2.4,4.35 -2.4,4.65 -1.15,4.65 ; -1.15,5.35 -2.4,5.35 -2.4,5.65 -1.15,5.65 ; -1.15,6.35 -2.4,6.35 -2.4,6.65 -1.15,6.65 ; -1.15,7.35 -2.4,7.35 -2.4,7.65 -1.15,7.65 ; -1.15,8.35 -2.4,8.35 -2.4,8.65 -1.15,8.65 ; -1.15,9.35 -2.4,9.35 -2.4,9.65 -1.15,9.65 ; -1.15,10.35 -2.4,10.35 -2.4,10.65 -1.15,10.65 ; 1.15,-10.65 2.4,-10.65 2.4,-10.35 1.15,-10.35 ; 1.15,-9.65 2.4,-9.65 2.4,-9.35 1.15,-9.35 ; 1.15,-8.65 2.4,-8.65 2.4,-8.35 1.15,-8.35 ; 1.15,-7.65 2.4,-7.65 2.4,-7.35 1.15,-7.35 ; 1.15,-6.65 2.4,-6.65 2.4,-6.35 1.15,-6.35 ; 1.15,-5.65 2.4,-5.65 2.4,-5.35 1.15,-5.35 ; 1.15,-4.65 2.4,-4.65 2.4,-4.35 1.15,-4.35 ; 1.15,-3.65 2.4,-3.65 2.4,-3.35 1.15,-3.35 ; 1.15,-2.65 2.4,-2.65 2.4,-2.35 1.15,-2.35 ; 1.15,-1.65 2.4,-1.65 2.4,-1.35 1.15,-1.35 ; 1.15,-0.65 2.4,-0.65 2.4,-0.35 1.15,-0.35 ; 1.15,0.35 2.4,0.35 2.4,0.65 1.15,0.65 ; 1.15,1.35 2.4,1.35 2.4,1.65 1.15,1.65 ; 1.15,2.35 2.4,2.35 2.4,2.65 1.15,2.65 ; 1.15,3.35 2.4,3.35 2.4,3.65 1.15,3.65 ; 1.15,4.35 2.4,4.35 2.4,4.65 1.15,4.65 ; 1.15,5.35 2.4,5.35 2.4,5.65 1.15,5.65 ; 1.15,6.35 2.4,6.35 2.4,6.65 1.15,6.65 ; 1.15,7.35 2.4,7.35 2.4,7.65 1.15,7.65 ; 1.15,8.35 2.4,8.35 2.4,8.65 1.15,8.65 ; 1.15,9.35 2.4,9.35 2.4,9.65 1.15,9.65 ; 1.15,10.35 2.4,10.35 2.4,10.65 1.15,10.65 ; -1.15,10.65 -1.15,-11 1.15,-11 1.15,11 -0.8,11 -1.15,10.65
  text "'.Designator'" at 0.84,-4.047 h1